# Altium footprint library PcbLib_ICs.PcbLib: 317 footprints (part 3 of 24)
Each footprint in its own frame and in the unit in brackets; x right, y up, seen from the top. Pads: shape width x height; smd on the part's side, far side on the other; paste and mask are expansions set on the pad; w line width, h text height; cw(c..) or ccw(c..) is an arc to the next point about the centre after c.
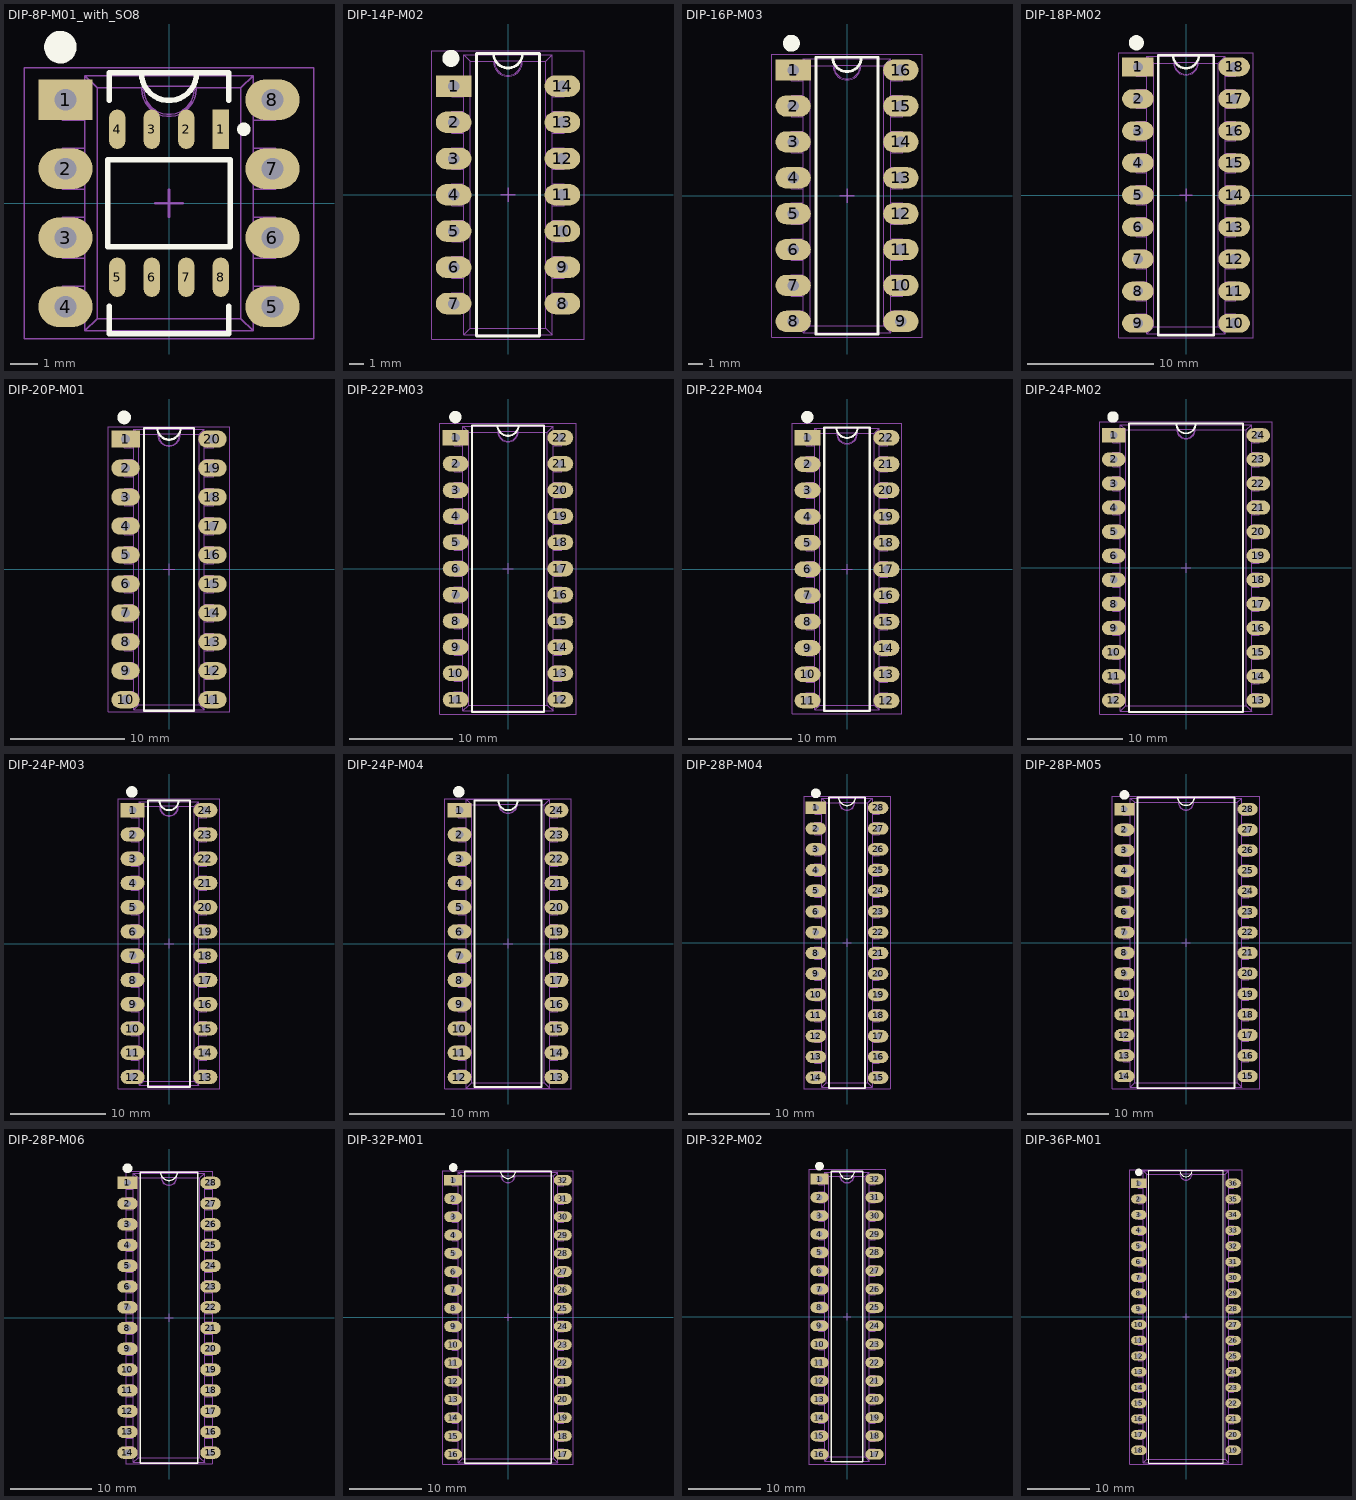
[diagram p2: the footprints below, top view; thin cyan lines are the x and y axes]

## DIP-8P-M01_with_SO8 [mm] "Plastic DIP, 8 pin, lead pitch 2.54mm (0.1\"), row spacing 7.62mm (0.3\")."
height 1.75
pads (16):
  rect 2x1.5 hole 0.8 mask+0.075: 1(-3.81,3.81)
  rect 0.6x1.45 smd paste+0 mask+0.05: 1(1.905,2.725)
  oval 2x1.5 hole 0.8 mask+0.075: 2(-3.81,1.27) 3(-3.81,-1.27) 4(-3.81,-3.81) 5(3.81,-3.81) 6(3.81,-1.27) 7(3.81,1.27) 8(3.81,3.81)
  oval 0.6x1.45 smd paste+0 mask+0.05: 2(0.635,2.725) 3(-0.635,2.725) 4(-1.905,2.725) 5(-1.905,-2.725) 6(-0.635,-2.725) 7(0.635,-2.725) 8(1.905,-2.725)
Top Overlay:
  circle w0.25: c2.755,2.725 r0.125
  circle w0.6: c-4,5.75 r0.3
  lines w0.2: -2.2,-3.8 -2.2,-4.8 2.2,-4.8 2.2,-3.8 ; -2.2,3.8 -2.2,4.8 2.2,4.8 2.2,3.8 ; -1.016,4.8 ccw(c0,4.8) 1.016,4.8 ; -2.25,-1.6 2.25,-1.6 2.25,1.6 -2.25,1.6 -2.25,-1.6
Top Assy:
  lines w0.05: -3.1,-4.06 -3.41,-4.06 ; -3.1,-3.05 -3.41,-3.05 ; -3.1,-2.03 -3.41,-2.03 ; -3.1,-0.51 -3.41,-0.51 ; -3.1,0.51 -3.41,0.51 ; -3.1,2.03 -3.41,2.03 ; -3.1,3.05 -3.41,3.05 ; -3.1,4.06 -3.41,4.06 ; 3.1,-4.06 3.41,-4.06 ; 3.1,-3.05 3.41,-3.05 ; 3.1,-2.03 3.41,-2.03 ; 3.1,-0.51 3.41,-0.51 ; 3.1,0.51 3.41,0.51 ; 3.1,2.03 3.41,2.03 ; 3.1,3.05 3.41,3.05 ; 3.1,4.06 3.41,4.06 ; -3.41,-4.06 -3.935,-4.06 -3.935,-3.05 -3.41,-3.05 ; -3.41,-4.06 -3.41,-3.05 ; -3.41,-2.03 -3.935,-2.03 -3.935,-0.51 -3.41,-0.51 ; -3.41,-2.03 -3.41,-0.51 ; -3.41,0.51 -3.935,0.51 -3.935,2.03 -3.41,2.03 ; -3.41,0.51 -3.41,2.03 ; -3.41,3.05 -3.935,3.05 -3.935,4.06 -3.41,4.06 ; -3.41,3.05 -3.41,4.06 ; -3.1,-4.7 -3.1,4.7 ; -3.1,-4.7 -2.65,-4.25 ; -3.1,-4.7 3.1,-4.7 ; -3.1,4.7 3.1,4.7 ; -3.1,4.7 -2.65,4.25 ; -2.65,-4.25 2.65,-4.25 ; -2.65,-4.25 -2.65,4.25 ; -2.65,4.25 -1,4.25 ; -1,4.2 ccw(c0,4.2) 1,4.2 ; -1,4.2 -1,4.25 ; -1,4.2 -0.927,4.2 ; -1,4.25 -0.927,4.304 ; -0.927,4.2 ccw(c0,4.2) 0.927,4.2 ; -0.927,4.2 -0.927,4.304 ; -0.927,4.304 0.927,4.304 ; 0.927,4.2 0.927,4.304 ; 0.927,4.2 1,4.2 ; 0.927,4.304 1,4.25 ; 1,4.2 1,4.25 ; 1,4.25 2.65,4.25 ; 2.65,-4.25 2.65,4.25 ; 2.65,-4.25 3.1,-4.7 ; 2.65,4.25 3.1,4.7 ; 3.1,-4.7 3.1,4.7 ; 3.41,-4.06 3.935,-4.06 3.935,-3.05 3.41,-3.05 ; 3.41,-4.06 3.41,-3.05 ; 3.41,-2.03 3.935,-2.03 3.935,-0.51 3.41,-0.51 ; 3.41,-2.03 3.41,-0.51 ; 3.41,0.51 3.935,0.51 3.935,2.03 3.41,2.03 ; 3.41,0.51 3.41,2.03 ; 3.41,3.05 3.935,3.05 3.935,4.06 3.41,4.06 ; 3.41,3.05 3.41,4.06
  text ".Designator" at 0.7,-5.162 h3
Top Text:
  lines w0.05: -5.334,-5 5.334,-5 5.334,5 -5.334,5 -5.334,-5
  lines w0.1: -0.5,0 0.5,0 ; 0,-0.5 0,0.5
3D body "User Library-DIP-8P-M01.step": height 4.36, standoff -3, extent -3.937,-4.7 3.933,4.7

## DIP-14P-M02 [mm] "Plastic DIP, 14 pin, lead pitch 2.54mm (0.1\"), row spacing 7.62mm (0.3\")"
height 1.75
pads (14):
  rect 2.5x1.5 hole 0.8 mask+0.075: 1(-3.81,7.62)
  oval 2.5x1.5 hole 0.8 mask+0.075: 2(-3.81,5.08) 3(-3.81,2.54) 4(-3.81,0) 5(-3.81,-2.54) 6(-3.81,-5.08) 7(-3.81,-7.62) 8(3.81,-7.62) 9(3.81,-5.08) 10(3.81,-2.54) 11(3.81,0) 12(3.81,2.54) 13(3.81,5.08) 14(3.81,7.62)
Top Overlay:
  circle w0.6: c-4,9.56 r0.3
  lines w0.2: -1.016,9.9 ccw(c0,9.9) 1.016,9.9 ; -2.2,-9.9 -2.2,9.9 2.2,9.9 2.2,-9.9 -2.2,-9.9
Top Assy:
  lines w0.05: -3.1,-7.87 -3.41,-7.87 ; -3.1,-6.86 -3.41,-6.86 ; -3.1,-5.84 -3.41,-5.84 ; -3.1,-4.32 -3.41,-4.32 ; -3.1,-3.3 -3.41,-3.3 ; -3.1,-1.78 -3.41,-1.78 ; -3.1,-0.76 -3.41,-0.76 ; -3.1,0.76 -3.41,0.76 ; -3.1,1.78 -3.41,1.78 ; -3.1,3.3 -3.41,3.3 ; -3.1,4.32 -3.41,4.32 ; -3.1,5.84 -3.41,5.84 ; -3.1,6.86 -3.41,6.86 ; -3.1,7.87 -3.41,7.87 ; 3.1,-7.87 3.41,-7.87 ; 3.1,-6.86 3.41,-6.86 ; 3.1,-5.84 3.41,-5.84 ; 3.1,-4.32 3.41,-4.32 ; 3.1,-3.3 3.41,-3.3 ; 3.1,-1.78 3.41,-1.78 ; 3.1,-0.76 3.41,-0.76 ; 3.1,0.76 3.41,0.76 ; 3.1,1.78 3.41,1.78 ; 3.1,3.3 3.41,3.3 ; 3.1,4.32 3.41,4.32 ; 3.1,5.84 3.41,5.84 ; 3.1,6.86 3.41,6.86 ; 3.1,7.87 3.41,7.87 ; -3.41,-7.87 -3.935,-7.87 -3.935,-6.86 -3.41,-6.86 ; -3.41,-7.87 -3.41,-6.86 ; -3.41,-5.84 -3.935,-5.84 -3.935,-4.32 -3.41,-4.32 ; -3.41,-5.84 -3.41,-4.32 ; -3.41,-3.3 -3.935,-3.3 -3.935,-1.78 -3.41,-1.78 ; -3.41,-3.3 -3.41,-1.78 ; -3.41,-0.76 -3.935,-0.76 -3.935,0.76 -3.41,0.76 ; -3.41,-0.76 -3.41,0.76 ; -3.41,1.78 -3.935,1.78 -3.935,3.3 -3.41,3.3 ; -3.41,1.78 -3.41,3.3 ; -3.41,4.32 -3.935,4.32 -3.935,5.84 -3.41,5.84 ; -3.41,4.32 -3.41,5.84 ; -3.41,6.86 -3.935,6.86 -3.935,7.87 -3.41,7.87 ; -3.41,6.86 -3.41,7.87 ; -3.1,-9.8 -3.1,9.8 ; -3.1,-9.8 -2.65,-9.35 ; -3.1,-9.8 3.1,-9.8 ; -3.1,9.8 3.1,9.8 ; -3.1,9.8 -2.65,9.35 ; -2.65,-9.35 2.65,-9.35 ; -2.65,-9.35 -2.65,9.35 ; -2.65,9.35 -1,9.35 ; -1,9.3 ccw(c0,9.3) 1,9.3 ; -1,9.3 -1,9.35 ; -1,9.3 -0.927,9.3 ; -1,9.35 -0.927,9.404 ; -0.927,9.3 ccw(c0,9.3) 0.927,9.3 ; -0.927,9.3 -0.927,9.404 ; -0.927,9.404 0.927,9.404 ; 0.927,9.3 0.927,9.404 ; 0.927,9.3 1,9.3 ; 0.927,9.404 1,9.35 ; 1,9.3 1,9.35 ; 1,9.35 2.65,9.35 ; 2.65,-9.35 2.65,9.35 ; 2.65,-9.35 3.1,-9.8 ; 2.65,9.35 3.1,9.8 ; 3.1,-9.8 3.1,9.8 ; 3.41,-7.87 3.935,-7.87 3.935,-6.86 3.41,-6.86 ; 3.41,-7.87 3.41,-6.86 ; 3.41,-5.84 3.935,-5.84 3.935,-4.32 3.41,-4.32 ; 3.41,-5.84 3.41,-4.32 ; 3.41,-3.3 3.935,-3.3 3.935,-1.78 3.41,-1.78 ; 3.41,-3.3 3.41,-1.78 ; 3.41,-0.76 3.935,-0.76 3.935,0.76 3.41,0.76 ; 3.41,-0.76 3.41,0.76 ; 3.41,1.78 3.935,1.78 3.935,3.3 3.41,3.3 ; 3.41,1.78 3.41,3.3 ; 3.41,4.32 3.935,4.32 3.935,5.84 3.41,5.84 ; 3.41,4.32 3.41,5.84 ; 3.41,6.86 3.935,6.86 3.935,7.87 3.41,7.87 ; 3.41,6.86 3.41,7.87
  text ".Designator" at 0.7,-5.162 h3
Top Text:
  lines w0.05: -5.334,-10.1 -5.334,10.1 5.334,10.1 5.334,-10.1 -5.334,-10.1
  lines w0.1: -0.5,0 0.5,0 ; 0,-0.5 0,0.5
3D body "User Library-DIP-14P-M02.step": height 4.36, standoff -3, extent -3.937,-9.8 3.933,9.8

## DIP-16P-M03 [mm] "Plastic DIP, 16 pin, lead pitch 2.54mm (0.1\"), row spacing 7.62mm (0.3\")"
height 1.75
pads (16):
  rect 2.5x1.5 hole 0.8 mask+0.075: 1(-3.81,8.89)
  oval 2.5x1.5 hole 0.8 mask+0.075: 2(-3.81,6.35) 3(-3.81,3.81) 4(-3.81,1.27) 5(-3.81,-1.27) 6(-3.81,-3.81) 7(-3.81,-6.35) 8(-3.81,-8.89) 9(3.81,-8.89) 10(3.81,-6.35) 11(3.81,-3.81) 12(3.81,-1.27) 13(3.81,1.27) 14(3.81,3.81) 15(3.81,6.35) 16(3.81,8.89)
Top Overlay:
  circle w0.6: c-3.937,10.795 r0.3
  lines w0.2: -1.016,9.8 ccw(c0,9.8) 1.016,9.8 ; -2.2,-9.8 2.2,-9.8 2.2,9.8 -2.2,9.8 -2.2,-9.8
Top Assy:
  lines w0.05: -3.1,-9.14 -3.41,-9.14 ; -3.1,-8.13 -3.41,-8.13 ; -3.1,-7.11 -3.41,-7.11 ; -3.1,-5.59 -3.41,-5.59 ; -3.1,-4.57 -3.41,-4.57 ; -3.1,-3.05 -3.41,-3.05 ; -3.1,-2.03 -3.41,-2.03 ; -3.1,-0.51 -3.41,-0.51 ; -3.1,0.51 -3.41,0.51 ; -3.1,2.03 -3.41,2.03 ; -3.1,3.05 -3.41,3.05 ; -3.1,4.57 -3.41,4.57 ; -3.1,5.59 -3.41,5.59 ; -3.1,7.11 -3.41,7.11 ; -3.1,8.13 -3.41,8.13 ; -3.1,9.14 -3.41,9.14 ; 3.1,-9.14 3.41,-9.14 ; 3.1,-8.13 3.41,-8.13 ; 3.1,-7.11 3.41,-7.11 ; 3.1,-5.59 3.41,-5.59 ; 3.1,-4.57 3.41,-4.57 ; 3.1,-3.05 3.41,-3.05 ; 3.1,-2.03 3.41,-2.03 ; 3.1,-0.51 3.41,-0.51 ; 3.1,0.51 3.41,0.51 ; 3.1,2.03 3.41,2.03 ; 3.1,3.05 3.41,3.05 ; 3.1,4.57 3.41,4.57 ; 3.1,5.59 3.41,5.59 ; 3.1,7.11 3.41,7.11 ; 3.1,8.13 3.41,8.13 ; 3.1,9.14 3.41,9.14 ; -3.41,-9.14 -3.41,-8.13 ; -3.41,-9.14 -3.935,-9.14 -3.935,-8.13 -3.41,-8.13 ; -3.41,-7.11 -3.41,-5.59 ; -3.41,-7.11 -3.935,-7.11 -3.935,-5.59 -3.41,-5.59 ; -3.41,-4.57 -3.41,-3.05 ; -3.41,-4.57 -3.935,-4.57 -3.935,-3.05 -3.41,-3.05 ; -3.41,-2.03 -3.41,-0.51 ; -3.41,-2.03 -3.935,-2.03 -3.935,-0.51 -3.41,-0.51 ; -3.41,0.51 -3.41,2.03 ; -3.41,0.51 -3.935,0.51 -3.935,2.03 -3.41,2.03 ; -3.41,3.05 -3.41,4.57 ; -3.41,3.05 -3.935,3.05 -3.935,4.57 -3.41,4.57 ; -3.41,5.59 -3.41,7.11 ; -3.41,5.59 -3.935,5.59 -3.935,7.11 -3.41,7.11 ; -3.41,8.13 -3.41,9.14 ; -3.41,8.13 -3.935,8.13 -3.935,9.14 -3.41,9.14 ; -3.1,-9.7 3.1,-9.7 ; -3.1,-9.7 -2.6,-9.2 ; -3.1,-9.7 -3.1,9.7 ; -3.1,9.7 -2.6,9.2 ; -3.1,9.7 3.1,9.7 ; -2.6,-9.2 -2.6,9.2 ; -2.6,-9.2 2.6,-9.2 ; -2.6,9.2 -1,9.2 ; -1,9.2 ccw(c0,9.2) 1,9.2 ; -1,9.2 -0.927,9.2 ; -1,9.2 -0.927,9.254 ; -0.927,9.2 ccw(c0,9.2) 0.927,9.2 ; -0.927,9.2 -0.927,9.254 ; -0.927,9.254 0.927,9.254 ; 0.927,9.2 1,9.2 ; 0.927,9.2 0.927,9.254 ; 0.927,9.254 1,9.2 ; 1,9.2 2.6,9.2 ; 2.6,-9.2 3.1,-9.7 ; 2.6,-9.2 2.6,9.2 ; 2.6,9.2 3.1,9.7 ; 3.1,-9.7 3.1,9.7 ; 3.41,-9.14 3.41,-8.13 ; 3.41,-9.14 3.935,-9.14 3.935,-8.13 3.41,-8.13 ; 3.41,-7.11 3.41,-5.59 ; 3.41,-7.11 3.935,-7.11 3.935,-5.59 3.41,-5.59 ; 3.41,-4.57 3.41,-3.05 ; 3.41,-4.57 3.935,-4.57 3.935,-3.05 3.41,-3.05 ; 3.41,-2.03 3.41,-0.51 ; 3.41,-2.03 3.935,-2.03 3.935,-0.51 3.41,-0.51 ; 3.41,0.51 3.41,2.03 ; 3.41,0.51 3.935,0.51 3.935,2.03 3.41,2.03 ; 3.41,3.05 3.41,4.57 ; 3.41,3.05 3.935,3.05 3.935,4.57 3.41,4.57 ; 3.41,5.59 3.41,7.11 ; 3.41,5.59 3.935,5.59 3.935,7.11 3.41,7.11 ; 3.41,8.13 3.41,9.14 ; 3.41,8.13 3.935,8.13 3.935,9.14 3.41,9.14
  text ".Designator" at 0.7,-5.162 h3
Top Text:
  lines w0.05: -5.334,-10 5.334,-10 5.334,10 -5.334,10 -5.334,-10
  lines w0.1: -0.5,0 0.5,0 ; 0,-0.5 0,0.5
3D body "User Library-DIP-16P-M03.step": height 4.66, standoff -3, extent -3.933,-9.7 3.937,9.7

## DIP-18P-M02 [mm] "Plastic DIP, 18 pin, lead pitch 2.54mm (0.1\"), row spacing 7.62mm (0.3\")"
height 1.75
pads (18):
  rect 2.5x1.5 hole 0.8 mask+0.075: 1(-3.81,10.16)
  oval 2.5x1.5 hole 0.8 mask+0.075: 2(-3.81,7.62) 3(-3.81,5.08) 4(-3.81,2.54) 5(-3.81,0) 6(-3.81,-2.54) 7(-3.81,-5.08) 8(-3.81,-7.62) 9(-3.81,-10.16) 10(3.81,-10.16) 11(3.81,-7.62) 12(3.81,-5.08) 13(3.81,-2.54) 14(3.81,0) 15(3.81,2.54) 16(3.81,5.08) 17(3.81,7.62) 18(3.81,10.16)
Top Overlay:
  circle w0.6: c-3.937,12.065 r0.3
  lines w0.2: -1.016,11.07 ccw(c0,11.07) 1.016,11.07 ; -2.2,-11.1 -2.2,11.07 2.2,11.07 2.2,-11.1 -2.2,-11.1
Top Assy:
  lines w0.05: -3.1,-10.41 -3.41,-10.41 ; -3.1,-9.4 -3.41,-9.4 ; -3.1,-8.38 -3.41,-8.38 ; -3.1,-6.86 -3.41,-6.86 ; -3.1,-5.84 -3.41,-5.84 ; -3.1,-4.32 -3.41,-4.32 ; -3.1,-3.3 -3.41,-3.3 ; -3.1,-1.78 -3.41,-1.78 ; -3.1,-0.76 -3.41,-0.76 ; -3.1,0.76 -3.41,0.76 ; -3.1,1.78 -3.41,1.78 ; -3.1,3.3 -3.41,3.3 ; -3.1,4.32 -3.41,4.32 ; -3.1,5.84 -3.41,5.84 ; -3.1,6.86 -3.41,6.86 ; -3.1,8.38 -3.41,8.38 ; -3.1,9.4 -3.41,9.4 ; -3.1,10.41 -3.41,10.41 ; -0.927,10.5 ccw(c0,10.5) 0.927,10.5 ; -0.927,10.503 -0.932,10.5 -0.999,10.45 ; -0.927,10.504 0.927,10.504 ; 0.927,10.503 0.932,10.5 0.999,10.45 ; 3.1,-10.41 3.41,-10.41 ; 3.1,-9.4 3.41,-9.4 ; 3.1,-8.38 3.41,-8.38 ; 3.1,-6.86 3.41,-6.86 ; 3.1,-5.84 3.41,-5.84 ; 3.1,-4.32 3.41,-4.32 ; 3.1,-3.3 3.41,-3.3 ; 3.1,-1.78 3.41,-1.78 ; 3.1,-0.76 3.41,-0.76 ; 3.1,0.76 3.41,0.76 ; 3.1,1.78 3.41,1.78 ; 3.1,3.3 3.41,3.3 ; 3.1,4.32 3.41,4.32 ; 3.1,5.84 3.41,5.84 ; 3.1,6.86 3.41,6.86 ; 3.1,8.38 3.41,8.38 ; 3.1,9.4 3.41,9.4 ; 3.1,10.41 3.41,10.41 ; -3.41,-10.41 -3.41,-9.4 ; -3.41,-10.41 -3.935,-10.41 -3.935,-9.4 -3.41,-9.4 ; -3.41,-8.38 -3.41,-6.86 ; -3.41,-8.38 -3.935,-8.38 -3.935,-6.86 -3.41,-6.86 ; -3.41,-5.84 -3.41,-4.32 ; -3.41,-5.84 -3.935,-5.84 -3.935,-4.32 -3.41,-4.32 ; -3.41,-3.3 -3.41,-1.78 ; -3.41,-3.3 -3.935,-3.3 -3.935,-1.78 -3.41,-1.78 ; -3.41,-0.76 -3.41,0.76 ; -3.41,-0.76 -3.935,-0.76 -3.935,0.76 -3.41,0.76 ; -3.41,1.78 -3.41,3.3 ; -3.41,1.78 -3.935,1.78 -3.935,3.3 -3.41,3.3 ; -3.41,4.32 -3.41,5.84 ; -3.41,4.32 -3.935,4.32 -3.935,5.84 -3.41,5.84 ; -3.41,6.86 -3.41,8.38 ; -3.41,6.86 -3.935,6.86 -3.935,8.38 -3.41,8.38 ; -3.41,9.4 -3.41,10.41 ; -3.41,9.4 -3.935,9.4 -3.935,10.41 -3.41,10.41 ; -3.1,-11 3.1,-11 ; -3.1,-11 -2.55,-10.45 ; -3.1,-11 -3.1,11 ; -3.1,11 3.1,11 ; -3.1,11 -2.55,10.45 ; -2.55,-10.45 -2.55,10.45 ; -2.55,-10.45 2.55,-10.45 ; -2.55,10.45 -0.999,10.45 ; -0.999,10.45 ccw(c0,10.5) 0.999,10.45 ; 0.999,10.45 2.55,10.45 ; 2.55,-10.45 2.55,10.45 ; 2.55,-10.45 3.1,-11 ; 2.55,10.45 3.1,11 ; 3.1,-11 3.1,11 ; 3.41,-10.41 3.41,-9.4 ; 3.41,-10.41 3.935,-10.41 3.935,-9.4 3.41,-9.4 ; 3.41,-8.38 3.41,-6.86 ; 3.41,-8.38 3.935,-8.38 3.935,-6.86 3.41,-6.86 ; 3.41,-5.84 3.41,-4.32 ; 3.41,-5.84 3.935,-5.84 3.935,-4.32 3.41,-4.32 ; 3.41,-3.3 3.41,-1.78 ; 3.41,-3.3 3.935,-3.3 3.935,-1.78 3.41,-1.78 ; 3.41,-0.76 3.41,0.76 ; 3.41,-0.76 3.935,-0.76 3.935,0.76 3.41,0.76 ; 3.41,1.78 3.41,3.3 ; 3.41,1.78 3.935,1.78 3.935,3.3 3.41,3.3 ; 3.41,4.32 3.41,5.84 ; 3.41,4.32 3.935,4.32 3.935,5.84 3.41,5.84 ; 3.41,6.86 3.41,8.38 ; 3.41,6.86 3.935,6.86 3.935,8.38 3.41,8.38 ; 3.41,9.4 3.41,10.41 ; 3.41,9.4 3.935,9.4 3.935,10.41 3.41,10.41
  text ".Designator" at 0.7,-5.162 h3
Top Text:
  lines w0.05: -5.334,-11.3 -5.334,11.27 5.334,11.27 5.334,-11.3 -5.334,-11.3
  lines w0.1: -0.5,0 0.5,0 ; 0,-0.5 0,0.5
3D body "User Library-DIP-18P-M02.step": height 5, standoff -3, extent -3.935,-11 3.935,11

## DIP-20P-M01 [mm] "Plastic DIP, 20 pin, lead pitch 2.54mm (0.1\"), row spacing 7.62mm (0.3\")"
height 1.75
pads (20):
  rect 2.5x1.5 hole 0.8 mask+0.075: 1(-3.81,11.43)
  oval 2.5x1.5 hole 0.8 mask+0.075: 2(-3.81,8.89) 3(-3.81,6.35) 4(-3.81,3.81) 5(-3.81,1.27) 6(-3.81,-1.27) 7(-3.81,-3.81) 8(-3.81,-6.35) 9(-3.81,-8.89) 10(-3.81,-11.43) 11(3.81,-11.43) 12(3.81,-8.89) 13(3.81,-6.35) 14(3.81,-3.81) 15(3.81,-1.27) 16(3.81,1.27) 17(3.81,3.81) 18(3.81,6.35) 19(3.81,8.89) 20(3.81,11.43)
Top Overlay:
  circle w0.6: c-3.937,13.335 r0.3
  lines w0.2: -1.016,12.4 ccw(c0,12.4) 1.016,12.4 ; -2.2,-12.4 2.2,-12.4 2.2,12.4 -2.2,12.4 -2.2,-12.4
Top Assy:
  lines w0.05: -3.1,-11.68 -3.41,-11.68 ; -3.1,-10.67 -3.41,-10.67 ; -3.1,-9.65 -3.41,-9.65 ; -3.1,-8.13 -3.41,-8.13 ; -3.1,-7.11 -3.41,-7.11 ; -3.1,-5.59 -3.41,-5.59 ; -3.1,-4.57 -3.41,-4.57 ; -3.1,-3.05 -3.41,-3.05 ; -3.1,-2.03 -3.41,-2.03 ; -3.1,-0.51 -3.41,-0.51 ; -3.1,0.51 -3.41,0.51 ; -3.1,2.03 -3.41,2.03 ; -3.1,3.05 -3.41,3.05 ; -3.1,4.57 -3.41,4.57 ; -3.1,5.59 -3.41,5.59 ; -3.1,7.11 -3.41,7.11 ; -3.1,8.13 -3.41,8.13 ; -3.1,9.65 -3.41,9.65 ; -3.1,10.67 -3.41,10.67 ; -3.1,11.68 -3.41,11.68 ; 3.1,-11.68 3.41,-11.68 ; 3.1,-10.67 3.41,-10.67 ; 3.1,-9.65 3.41,-9.65 ; 3.1,-8.13 3.41,-8.13 ; 3.1,-7.11 3.41,-7.11 ; 3.1,-5.59 3.41,-5.59 ; 3.1,-4.57 3.41,-4.57 ; 3.1,-3.05 3.41,-3.05 ; 3.1,-2.03 3.41,-2.03 ; 3.1,-0.51 3.41,-0.51 ; 3.1,0.51 3.41,0.51 ; 3.1,2.03 3.41,2.03 ; 3.1,3.05 3.41,3.05 ; 3.1,4.57 3.41,4.57 ; 3.1,5.59 3.41,5.59 ; 3.1,7.11 3.41,7.11 ; 3.1,8.13 3.41,8.13 ; 3.1,9.65 3.41,9.65 ; 3.1,10.67 3.41,10.67 ; 3.1,11.68 3.41,11.68 ; -3.41,-11.68 -3.41,-10.67 ; -3.41,-11.68 -3.935,-11.68 -3.935,-10.67 -3.41,-10.67 ; -3.41,-9.65 -3.41,-8.13 ; -3.41,-9.65 -3.935,-9.65 -3.935,-8.13 -3.41,-8.13 ; -3.41,-7.11 -3.41,-5.59 ; -3.41,-7.11 -3.935,-7.11 -3.935,-5.59 -3.41,-5.59 ; -3.41,-4.57 -3.41,-3.05 ; -3.41,-4.57 -3.935,-4.57 -3.935,-3.05 -3.41,-3.05 ; -3.41,-2.03 -3.41,-0.51 ; -3.41,-2.03 -3.935,-2.03 -3.935,-0.51 -3.41,-0.51 ; -3.41,0.51 -3.41,2.03 ; -3.41,0.51 -3.935,0.51 -3.935,2.03 -3.41,2.03 ; -3.41,3.05 -3.41,4.57 ; -3.41,3.05 -3.935,3.05 -3.935,4.57 -3.41,4.57 ; -3.41,5.59 -3.41,7.11 ; -3.41,5.59 -3.935,5.59 -3.935,7.11 -3.41,7.11 ; -3.41,8.13 -3.41,9.65 ; -3.41,8.13 -3.935,8.13 -3.935,9.65 -3.41,9.65 ; -3.41,10.67 -3.41,11.68 ; -3.41,10.67 -3.935,10.67 -3.935,11.68 -3.41,11.68 ; -3.1,-12.3 3.1,-12.3 ; -3.1,-12.3 -2.65,-11.85 ; -3.1,-12.3 -3.1,12.3 ; -3.1,12.3 -2.65,11.85 ; -3.1,12.3 3.1,12.3 ; -2.65,-11.85 -2.65,11.85 ; -2.65,-11.85 2.65,-11.85 ; -2.65,11.85 -1,11.85 ; -1,11.8 ccw(c0,11.8) 1,11.8 ; -1,11.8 -0.927,11.8 ; -1,11.8 -1,11.85 ; -1,11.85 -0.927,11.904 ; -0.927,11.8 ccw(c0,11.8) 0.927,11.8 ; -0.927,11.8 -0.927,11.904 ; -0.927,11.904 0.927,11.904 ; 0.927,11.8 1,11.8 ; 0.927,11.8 0.927,11.904 ; 0.927,11.904 1,11.85 ; 1,11.8 1,11.85 ; 1,11.85 2.65,11.85 ; 2.65,-11.85 3.1,-12.3 ; 2.65,-11.85 2.65,11.85 ; 2.65,11.85 3.1,12.3 ; 3.1,-12.3 3.1,12.3 ; 3.41,-11.68 3.41,-10.67 ; 3.41,-11.68 3.935,-11.68 3.935,-10.67 3.41,-10.67 ; 3.41,-9.65 3.41,-8.13 ; 3.41,-9.65 3.935,-9.65 3.935,-8.13 3.41,-8.13 ; 3.41,-7.11 3.41,-5.59 ; 3.41,-7.11 3.935,-7.11 3.935,-5.59 3.41,-5.59 ; 3.41,-4.57 3.41,-3.05 ; 3.41,-4.57 3.935,-4.57 3.935,-3.05 3.41,-3.05 ; 3.41,-2.03 3.41,-0.51 ; 3.41,-2.03 3.935,-2.03 3.935,-0.51 3.41,-0.51 ; 3.41,0.51 3.41,2.03 ; 3.41,0.51 3.935,0.51 3.935,2.03 3.41,2.03 ; 3.41,3.05 3.41,4.57 ; 3.41,3.05 3.935,3.05 3.935,4.57 3.41,4.57 ; 3.41,5.59 3.41,7.11 ; 3.41,5.59 3.935,5.59 3.935,7.11 3.41,7.11 ; 3.41,8.13 3.41,9.65 ; 3.41,8.13 3.935,8.13 3.935,9.65 3.41,9.65 ; 3.41,10.67 3.41,11.68 ; 3.41,10.67 3.935,10.67 3.935,11.68 3.41,11.68
  text ".Designator" at 0.7,-5.162 h3
Top Text:
  lines w0.05: -5.334,-12.5 5.334,-12.5 5.334,12.5 -5.334,12.5 -5.334,-12.5
  lines w0.1: -0.5,0 0.5,0 ; 0,-0.5 0,0.5
3D body "User Library-DIP-20P-M01.step": height 4.36, standoff -3, extent -3.935,-12.3 3.935,12.3

## DIP-22P-M03 [mm] "Plastic DIP, 22 pin, lead pitch 2.54mm (0.1\"), row spacing 10.16mm (0.4\")."
height 1.75
pads (22):
  rect 2.5x1.5 hole 0.8 mask+0.075: 1(-5.08,12.7)
  oval 2.5x1.5 hole 0.8 mask+0.075: 2(-5.08,10.16) 3(-5.08,7.62) 4(-5.08,5.08) 5(-5.08,2.54) 6(-5.08,0) 7(-5.08,-2.54) 8(-5.08,-5.08) 9(-5.08,-7.62) 10(-5.08,-10.16) 11(-5.08,-12.7) 12(5.08,-12.7) 13(5.08,-10.16) 14(5.08,-7.62) 15(5.08,-5.08) 16(5.08,-2.54) 17(5.08,0) 18(5.08,2.54) 19(5.08,5.08) 20(5.08,7.62) 21(5.08,10.16) 22(5.08,12.7)
Top Overlay:
  circle w0.6: c-5.1,14.7 r0.3
  lines w0.2: -1.016,13.9 ccw(c0,13.9) 1.016,13.9 ; -3.5,-13.9 -3.5,13.9 3.5,13.9 3.5,-13.9 -3.5,-13.9
Top Assy:
  drawing of 152 lines, arcs and shapes, not listed
  text ".Designator" at 0.7,-5.162 h3
Top Text:
  lines w0.05: -6.6,-14.1 -6.6,14.1 6.6,14.1 6.6,-14.1 -6.6,-14.1
  lines w0.1: -0.5,0 0.5,0 ; 0,-0.5 0,0.5
3D body "User Library-DIP-22P-M03.step": height 5, standoff -3, extent -5.205,-13.8 5.205,13.8

## DIP-22P-M04 [mm] "Plastic DIP, 22 pin, lead pitch 2.54mm (0.1\"), row spacing 7.62mm (0.4\")."
height 1.75
pads (22):
  rect 2.5x1.5 hole 0.8 mask+0.075: 1(-3.81,12.7)
  oval 2.5x1.5 hole 0.8 mask+0.075: 2(-3.81,10.16) 3(-3.81,7.62) 4(-3.81,5.08) 5(-3.81,2.54) 6(-3.81,0) 7(-3.81,-2.54) 8(-3.81,-5.08) 9(-3.81,-7.62) 10(-3.81,-10.16) 11(-3.81,-12.7) 12(3.81,-12.7) 13(3.81,-10.16) 14(3.81,-7.62) 15(3.81,-5.08) 16(3.81,-2.54) 17(3.81,0) 18(3.81,2.54) 19(3.81,5.08) 20(3.81,7.62) 21(3.81,10.16) 22(3.81,12.7)
Top Overlay:
  circle w0.6: c-3.83,14.7 r0.3
  lines w0.2: -1.016,13.7 ccw(c0,13.7) 1.016,13.7 ; -2.2,-13.7 2.2,-13.7 2.2,13.7 -2.2,13.7 -2.2,-13.7
Top Assy:
  drawing of 156 lines, arcs and shapes, not listed
  text ".Designator" at 0.7,-5.162 h3
Top Text:
  lines w0.05: -5.3,-14 -5.3,14.1 5.3,14.1 5.3,-14 -5.3,-14
  lines w0.1: -0.5,0 0.5,0 ; 0,-0.5 0,0.5
3D body "User Library-DIP-22P-M04.step": height 4.36, standoff -3, extent -3.935,-13.6 3.935,13.6

## DIP-24P-M02 [mm] "Plastic DIP, 24 pin, lead pitch 2.54mm (0.1\"), row spacing 15.24mm (0.6\")"
height 1.75
pads (24):
  rect 2.5x1.5 hole 0.8 mask+0.075: 1(-7.62,13.97)
  oval 2.5x1.5 hole 0.8 mask+0.075: 2(-7.62,11.43) 3(-7.62,8.89) 4(-7.62,6.35) 5(-7.62,3.81) 6(-7.62,1.27) 7(-7.62,-1.27) 8(-7.62,-3.81) 9(-7.62,-6.35) 10(-7.62,-8.89) 11(-7.62,-11.43) 12(-7.62,-13.97) 13(7.62,-13.97) 14(7.62,-11.43) 15(7.62,-8.89) 16(7.62,-6.35) 17(7.62,-3.81) 18(7.62,-1.27) 19(7.62,1.27) 20(7.62,3.81) 21(7.62,6.35) 22(7.62,8.89) 23(7.62,11.43) 24(7.62,13.97)
Top Overlay:
  circle w0.6: c-7.7,15.9 r0.3
  lines w0.2: -1.016,15.2 ccw(c0,15.2) 1.016,15.2 ; -6,-15.2 6,-15.2 6,15.2 -6,15.2 -6,-15.2
Top Assy:
  drawing of 164 lines, arcs and shapes, not listed
  text ".Designator" at 0.7,-5.162 h3
Top Text:
  lines w0.05: -9.1,-15.4 9.1,-15.4 9.1,15.4 -9.1,15.4 -9.1,-15.4
  lines w0.1: -0.5,0 0.5,0 ; 0,-0.5 0,0.5
3D body "User Library-DIP-24P-M02.step": height 5, standoff -3, extent -7.745,-15.1 7.745,15.1

## DIP-24P-M03 [mm] "Plastic DIP, 24 pin, lead pitch 2.54mm (0.1\"), row spacing 7.62mm (0.3\")"
height 1.75
pads (24):
  rect 2.5x1.5 hole 0.8 mask+0.075: 1(-3.81,13.97)
  oval 2.5x1.5 hole 0.8 mask+0.075: 2(-3.81,11.43) 3(-3.81,8.89) 4(-3.81,6.35) 5(-3.81,3.81) 6(-3.81,1.27) 7(-3.81,-1.27) 8(-3.81,-3.81) 9(-3.81,-6.35) 10(-3.81,-8.89) 11(-3.81,-11.43) 12(-3.81,-13.97) 13(3.81,-13.97) 14(3.81,-11.43) 15(3.81,-8.89) 16(3.81,-6.35) 17(3.81,-3.81) 18(3.81,-1.27) 19(3.81,1.27) 20(3.81,3.81) 21(3.81,6.35) 22(3.81,8.89) 23(3.81,11.43) 24(3.81,13.97)
Top Overlay:
  circle w0.6: c-3.89,15.9 r0.3
  lines w0.2: -1.016,15 ccw(c0,15) 1.016,15 ; -2.2,-15 -2.2,15 2.2,15 2.2,-15 -2.2,-15
Top Assy:
  drawing of 168 lines, arcs and shapes, not listed
  text ".Designator" at 0.7,-5.162 h3
Top Text:
  lines w0.05: -5.3,-15.2 5.3,-15.2 5.3,15.2 -5.3,15.2 -5.3,-15.2
  lines w0.1: -0.5,0 0.5,0 ; 0,-0.5 0,0.5
3D body "User Library-DIP-24P-M03.step": height 4.36, standoff -3, extent -3.935,-14.85 3.935,14.85

## DIP-24P-M04 [mm] "Plastic DIP, 24 pin, lead pitch 2.54mm (0.1\"), row spacing 10.16mm (0.4\")"
height 1.75
pads (24):
  rect 2.5x1.5 hole 0.8 mask+0.075: 1(-5.08,13.97)
  oval 2.5x1.5 hole 0.8 mask+0.075: 2(-5.08,11.43) 3(-5.08,8.89) 4(-5.08,6.35) 5(-5.08,3.81) 6(-5.08,1.27) 7(-5.08,-1.27) 8(-5.08,-3.81) 9(-5.08,-6.35) 10(-5.08,-8.89) 11(-5.08,-11.43) 12(-5.08,-13.97) 13(5.08,-13.97) 14(5.08,-11.43) 15(5.08,-8.89) 16(5.08,-6.35) 17(5.08,-3.81) 18(5.08,-1.27) 19(5.08,1.27) 20(5.08,3.81) 21(5.08,6.35) 22(5.08,8.89) 23(5.08,11.43) 24(5.08,13.97)
Top Overlay:
  circle w0.6: c-5.16,15.9 r0.3
  lines w0.2: -1.016,15 ccw(c0,15) 1.016,15 ; -3.5,-15 -3.5,15 3.5,15 3.5,-15 -3.5,-15
Top Assy:
  drawing of 162 lines, arcs and shapes, not listed
  text ".Designator" at 0.7,-5.162 h3
Top Text:
  lines w0.05: -6.6,-15.2 6.6,-15.2 6.6,15.2 -6.6,15.2 -6.6,-15.2
  lines w0.1: -0.5,0 0.5,0 ; 0,-0.5 0,0.5
3D body "User Library-DIP-24P-M04.step": height 5.2, standoff -3, extent -5.192,-15.187 5.218,15.113

## DIP-28P-M04 [mm] "Plastic DIP, 28 pin, lead pitch 2.54mm (0.1\"), row spacing 7.62mm (0.3\")"
height 1.75
pads (28):
  rect 2.5x1.5 hole 0.8 mask+0.075: 1(-3.81,16.51)
  oval 2.5x1.5 hole 0.8 mask+0.075: 2(-3.81,13.97) 3(-3.81,11.43) 4(-3.81,8.89) 5(-3.81,6.35) 6(-3.81,3.81) 7(-3.81,1.27) 8(-3.81,-1.27) 9(-3.81,-3.81) 10(-3.81,-6.35) 11(-3.81,-8.89) 12(-3.81,-11.43) 13(-3.81,-13.97) 14(-3.81,-16.51) 15(3.81,-16.51) 16(3.81,-13.97) 17(3.81,-11.43) 18(3.81,-8.89) 19(3.81,-6.35) 20(3.81,-3.81) 21(3.81,-1.27) 22(3.81,1.27) 23(3.81,3.81) 24(3.81,6.35) 25(3.81,8.89) 26(3.81,11.43) 27(3.81,13.97) 28(3.81,16.51)
Top Overlay:
  circle w0.6: c-3.81,18.288 r0.3
  lines w0.2: -1.016,17.8 ccw(c0,17.8) 1.016,17.8 ; -2.2,-17.8 2.2,-17.8 2.2,17.8 -2.2,17.8 -2.2,-17.8
Top Assy:
  drawing of 186 lines, arcs and shapes, not listed
  text ".Designator" at 0.7,-5.162 h3
Top Text:
  lines w0.05: -5.3,-17.9 5.3,-17.9 5.3,17.9 -5.3,17.9 -5.3,-17.9
  lines w0.1: -0.5,0 0.5,0 ; 0,-0.5 0,0.5
3D body "User Library-DIP-28P-M04.step": height 5.2, standoff -3, extent -3.935,-17.7 3.935,17.7

## DIP-28P-M05 [mm] "Plastic DIP, 28 pin, lead pitch 2.54mm (0.1\"), row spacing 15.24mm (0.6\")"
height 1.75
pads (28):
  rect 2.5x1.5 hole 0.8 mask+0.075: 1(-7.62,16.51)
  oval 2.5x1.5 hole 0.8 mask+0.075: 2(-7.62,13.97) 3(-7.62,11.43) 4(-7.62,8.89) 5(-7.62,6.35) 6(-7.62,3.81) 7(-7.62,1.27) 8(-7.62,-1.27) 9(-7.62,-3.81) 10(-7.62,-6.35) 11(-7.62,-8.89) 12(-7.62,-11.43) 13(-7.62,-13.97) 14(-7.62,-16.51) 15(7.62,-16.51) 16(7.62,-13.97) 17(7.62,-11.43) 18(7.62,-8.89) 19(7.62,-6.35) 20(7.62,-3.81) 21(7.62,-1.27) 22(7.62,1.27) 23(7.62,3.81) 24(7.62,6.35) 25(7.62,8.89) 26(7.62,11.43) 27(7.62,13.97) 28(7.62,16.51)
Top Overlay:
  circle w0.6: c-7.62,18.288 r0.3
  lines w0.2: -1.016,18 ccw(c0,18) 1.016,18 ; -6,-18 -6,18 6,18 6,-18 -6,-18
Top Assy:
  drawing of 188 lines, arcs and shapes, not listed
  text ".Designator" at 0.7,-5.162 h3
Top Text:
  lines w0.05: -9.1,-18.1 -9.1,18.1 9.1,18.1 9.1,-18.1 -9.1,-18.1
  lines w0.1: -0.5,0 0.5,0 ; 0,-0.5 0,0.5
3D body "User Library-DIP-28P-M05.step": height 5, standoff -3, extent -7.745,-17.9 7.745,17.9

## DIP-28P-M06 [mm] "Plastic DIP, 28 pin, lead pitch 2.54mm (0.1\"), row spacing 10.16mm (0.4\")"
height 1.75
pads (28):
  rect 2.5x1.5 hole 0.8 mask+0.075: 1(-5.08,16.51)
  oval 2.5x1.5 hole 0.8 mask+0.075: 2(-5.08,13.97) 3(-5.08,11.43) 4(-5.08,8.89) 5(-5.08,6.35) 6(-5.08,3.81) 7(-5.08,1.27) 8(-5.08,-1.27) 9(-5.08,-3.81) 10(-5.08,-6.35) 11(-5.08,-8.89) 12(-5.08,-11.43) 13(-5.08,-13.97) 14(-5.08,-16.51) 15(5.08,-16.51) 16(5.08,-13.97) 17(5.08,-11.43) 18(5.08,-8.89) 19(5.08,-6.35) 20(5.08,-3.81) 21(5.08,-1.27) 22(5.08,1.27) 23(5.08,3.81) 24(5.08,6.35) 25(5.08,8.89) 26(5.08,11.43) 27(5.08,13.97) 28(5.08,16.51)
Top Overlay:
  circle w0.6: c-5.08,18.288 r0.3
  lines w0.2: -1.016,17.8 ccw(c0,17.8) 1.016,17.8 ; -3.5,-17.8 -3.5,17.8 3.5,17.8 3.5,-17.8 -3.5,-17.8
Top Assy:
  drawing of 186 lines, arcs and shapes, not listed
  text ".Designator" at 0.7,-5.162 h3
Top Text:
  lines w0.05: -5.3,-17.9 -5.3,17.9 5.3,17.9 5.3,-17.9 -5.3,-17.9
  lines w0.1: -0.5,0 0.5,0 ; 0,-0.5 0,0.5
3D body "User Library-DIP-28P-M06.step": height 5.2, standoff -3, extent -5.205,-17.7 5.205,17.7

## DIP-32P-M01 [mm] "Plastic DIP, 32 pin, lead pitch 2.54mm (0.1\"), row spacing 15.24mm (0.6\")"
height 1.75
pads (32):
  rect 2.5x1.5 hole 0.8 mask+0.075: 1(-7.62,19.05)
  oval 2.5x1.5 hole 0.8 mask+0.075: 2(-7.62,16.51) 3(-7.62,13.97) 4(-7.62,11.43) 5(-7.62,8.89) 6(-7.62,6.35) 7(-7.62,3.81) 8(-7.62,1.27) 9(-7.62,-1.27) 10(-7.62,-3.81) 11(-7.62,-6.35) 12(-7.62,-8.89) 13(-7.62,-11.43) 14(-7.62,-13.97) 15(-7.62,-16.51) 16(-7.62,-19.05) 17(7.62,-19.05) 18(7.62,-16.51) 19(7.62,-13.97) 20(7.62,-11.43) 21(7.62,-8.89) 22(7.62,-6.35) 23(7.62,-3.81) 24(7.62,-1.27) 25(7.62,1.27) 26(7.62,3.81) 27(7.62,6.35) 28(7.62,8.89) 29(7.62,11.43) 30(7.62,13.97) 31(7.62,16.51) 32(7.62,19.05)
Top Overlay:
  circle w0.6: c-7.62,20.828 r0.3
  lines w0.2: -1.016,20.3 ccw(c0,20.3) 1.016,20.3 ; -6,-20.3 6,-20.3 6,20.3 -6,20.3 -6,-20.3
Top Assy:
  drawing of 212 lines, arcs and shapes, not listed
  text ".Designator" at 0.7,-5.162 h3
Top Text:
  lines w0.05: -9.1,-20.4 9.1,-20.4 9.1,20.4 -9.1,20.4 -9.1,-20.4
  lines w0.1: -0.5,0 0.5,0 ; 0,-0.5 0,0.5
3D body "User Library-DIP-32P-M01.step": height 5, standoff -3, extent -7.745,-20.2 7.745,20.2

## DIP-32P-M02 [mm] "Plastic DIP, 32 pin, lead pitch 2.54mm (0.1\"), row spacing 7.62mm (0.3\")"
height 1.75
pads (32):
  rect 2.5x1.5 hole 0.8 mask+0.075: 1(-3.81,19.05)
  oval 2.5x1.5 hole 0.8 mask+0.075: 2(-3.81,16.51) 3(-3.81,13.97) 4(-3.81,11.43) 5(-3.81,8.89) 6(-3.81,6.35) 7(-3.81,3.81) 8(-3.81,1.27) 9(-3.81,-1.27) 10(-3.81,-3.81) 11(-3.81,-6.35) 12(-3.81,-8.89) 13(-3.81,-11.43) 14(-3.81,-13.97) 15(-3.81,-16.51) 16(-3.81,-19.05) 17(3.81,-19.05) 18(3.81,-16.51) 19(3.81,-13.97) 20(3.81,-11.43) 21(3.81,-8.89) 22(3.81,-6.35) 23(3.81,-3.81) 24(3.81,-1.27) 25(3.81,1.27) 26(3.81,3.81) 27(3.81,6.35) 28(3.81,8.89) 29(3.81,11.43) 30(3.81,13.97) 31(3.81,16.51) 32(3.81,19.05)
Top Overlay:
  circle w0.6: c-3.81,20.828 r0.3
  lines w0.2: -1.016,20.1 ccw(c0,20.1) 1.016,20.1 ; -2.2,-20.1 -2.2,20.1 2.2,20.1 2.2,-20.1 -2.2,-20.1
Top Assy:
  drawing of 210 lines, arcs and shapes, not listed
  text ".Designator" at 0.7,-5.162 h3
Top Text:
  lines w0.05: -5.3,-20.4 -5.3,20.4 5.3,20.4 5.3,-20.4 -5.3,-20.4
  lines w0.1: -0.5,0 0.5,0 ; 0,-0.5 0,0.5
3D body "User Library-DIP-32P-M02.step": height 5.2, standoff -3, extent -3.935,-20 3.935,20

## DIP-36P-M01 [mm] "Plastic DIP, 36 pin, lead pitch 2.54mm (0.1\"), row spacing 15.24mm (0.6\")"
height 1.75
pads (36):
  rect 2.5x1.5 hole 0.8 mask+0.075: 1(-7.62,21.59)
  oval 2.5x1.5 hole 0.8 mask+0.075: 2(-7.62,19.05) 3(-7.62,16.51) 4(-7.62,13.97) 5(-7.62,11.43) 6(-7.62,8.89) 7(-7.62,6.35) 8(-7.62,3.81) 9(-7.62,1.27) 10(-7.62,-1.27) 11(-7.62,-3.81) 12(-7.62,-6.35) 13(-7.62,-8.89) 14(-7.62,-11.43) 15(-7.62,-13.97) 16(-7.62,-16.51) 17(-7.62,-19.05) 18(-7.62,-21.59) 19(7.62,-21.59) 20(7.62,-19.05) 21(7.62,-16.51) 22(7.62,-13.97) 23(7.62,-11.43) 24(7.62,-8.89) 25(7.62,-6.35) 26(7.62,-3.81) 27(7.62,-1.27) 28(7.62,1.27) 29(7.62,3.81) 30(7.62,6.35) 31(7.62,8.89) 32(7.62,11.43) 33(7.62,13.97) 34(7.62,16.51) 35(7.62,19.05) 36(7.62,21.59)
Top Overlay:
  circle w0.6: c-7.62,23.368 r0.3
  lines w0.2: -1.016,23.7 ccw(c0,23.7) 1.016,23.7 ; -6,-23.7 6,-23.7 6,23.7 -6,23.7 -6,-23.7
Top Assy:
  drawing of 236 lines, arcs and shapes, not listed
  text ".Designator" at 0.7,-5.162 h3
Top Text:
  lines w0.05: -9.1,-23.8 9.1,-23.8 9.1,23.8 -9.1,23.8 -9.1,-23.8
  lines w0.1: -0.5,0 0.5,0 ; 0,-0.5 0,0.5
3D body "User Library-DIP-36P-M01.step": height 5, standoff -3, extent -7.745,-23.6 7.745,23.6